# Altium footprint library ThanhNT.PcbLib: 579 footprints (part 7 of 37)
Each footprint in its own frame and in the unit in brackets; x right, y up, seen from the top. Pads: shape width x height; smd on the part's side, far side on the other; paste and mask are expansions set on the pad; w line width, h text height; cw(c..) or ccw(c..) is an arc to the next point about the centre after c.
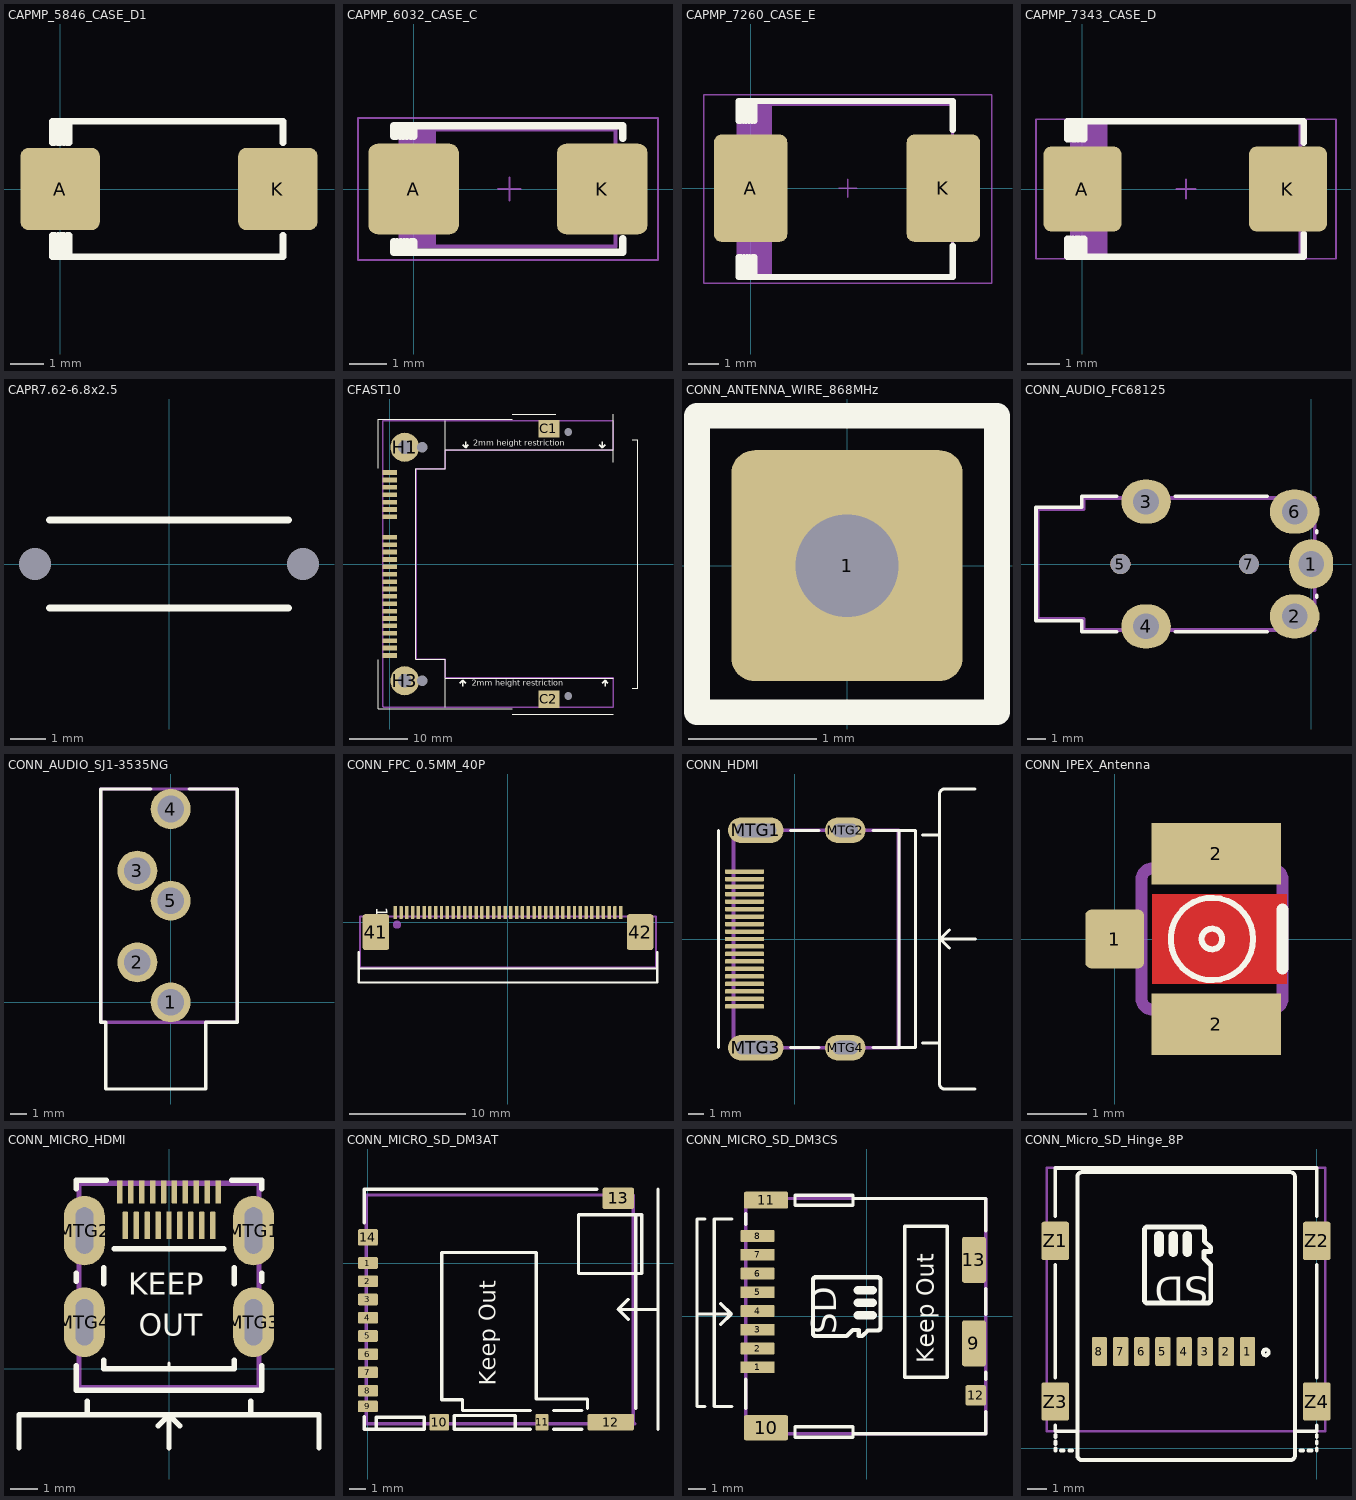
[diagram p6: the footprints below, top view; thin cyan lines are the x and y axes]

## CAPMP_5846_CASE_D1 [mm] "Tatalum Capacitor SMD (5846_2318), Molded body capacitor"
height 3.2
pads (2):
  rrect20% 2.4x2.5 smd: A(0,0) K(6.6,0)
Top Overlay:
  lines w0.2: -0.243,-1.412 -0.243,-2.057 6.757,-2.057 6.757,-1.397 ; -0.243,1.412 -0.243,2.057 6.757,2.057 6.757,1.397 ; -0.178,1.412 -0.178,2.057 ; -0.167,-2.057 -0.167,-1.412 ; -0.076,1.412 -0.076,2.057 ; -0.065,-2.057 -0.065,-1.412 ; 0,1.412 0,2.057 ; 0.036,-2.057 0.036,-1.412 ; 0.102,1.412 0.102,2.057 ; 0.112,-2.057 0.112,-1.412 ; 0.203,1.412 0.203,2.057 ; 0.214,-2.057 0.214,-1.412 ; 0.279,-2.057 0.279,-1.412 ; 0.279,1.412 0.279,2.057
3D body "User Library-CaseD_7343-31.STEP": height 2.8, standoff 0, extent -0.348,-2.15 6.952,2.15

## CAPMP_6032_CASE_C [mm] "Tatalum Capacitor SMD (6032_2412), Molded body capacitor"
height 2.6
pads (2):
  rrect20% 2.4x2.4 smd: A(0,0) K(5,0)
Top Overlay:
  lines w0.2: -0.523,-1.397 -0.523,-1.676 5.537,-1.676 5.537,-1.321 ; -0.523,1.397 -0.523,1.676 5.537,1.676 5.537,1.346 ; -0.457,1.397 -0.457,1.676 ; -0.446,-1.676 -0.446,-1.397 ; -0.356,1.397 -0.356,1.676 ; -0.345,-1.676 -0.345,-1.397 ; -0.279,1.397 -0.279,1.676 ; -0.243,-1.676 -0.243,-1.397 ; -0.178,1.397 -0.178,1.676 ; -0.167,-1.676 -0.167,-1.397 ; -0.076,1.397 -0.076,1.676 ; -0.065,-1.676 -0.065,-1.397 ; 0,-1.676 0,-1.397 ; 0,1.397 0,1.676
Mechanical 15:
  lines w0.05: 2.24,0 2.84,0 ; 2.54,-0.3 2.54,0.3 ; -1.473,-1.88 6.477,-1.88 6.477,1.88 -1.473,1.88 -1.473,-1.88
Mechanical 16:
  rectangle: -0.5,-1.075 -0.3,1.125
  region: 5.5,1.125 5.3,1.125 5.3,-1.075 5.5,-1.075
  rectangle: -0.35,-1.525 0.6,1.575
  lines w0.102: -0.35,-1.525 5.35,-1.525 5.35,1.575 -0.35,1.575 -0.35,-1.525
3D body "User Library-CaseC_6032-28.STEP": height 2.5, standoff 0, extent -0.46,-1.6 5.54,1.6

## CAPMP_7260_CASE_E [mm] "Tatalum Capacitor SMD (7260_2824), Molded body capacitor"
height 4.1
pads (2):
  rrect20% 2.4x3.5 smd: A(0,0) K(6.3,0)
Top Overlay:
  lines w0.2: -0.396,-2.25 -0.396,-2.896 6.604,-2.896 6.604,-1.88 ; -0.396,2.199 -0.396,2.845 6.604,2.845 6.604,1.905 ; -0.33,2.199 -0.33,2.845 ; -0.319,-2.896 -0.319,-2.25 ; -0.229,2.199 -0.229,2.845 ; -0.218,-2.896 -0.218,-2.25 ; -0.152,2.199 -0.152,2.845 ; -0.116,-2.896 -0.116,-2.25 ; -0.051,2.199 -0.051,2.845 ; -0.04,-2.896 -0.04,-2.25 ; 0.051,2.199 0.051,2.845 ; 0.062,-2.896 0.062,-2.25 ; 0.127,-2.896 0.127,-2.25 ; 0.127,2.199 0.127,2.845
Mechanical 15:
  lines w0.05: 2.875,0 3.475,0 ; 3.175,-0.3 3.175,0.3 ; -1.525,-3.099 -1.525,3.048 7.875,3.048 7.875,-3.099 -1.525,-3.099
Mechanical 16:
  rectangle: -0.401,-2.845 0.699,2.743
  region: 6.749,1.251 6.549,1.251 6.549,-1.149 6.749,-1.149
  rectangle: -0.551,-1.149 -0.351,1.251
  lines w0.102: -0.401,-2.845 -0.401,2.743 6.599,2.743 6.599,-2.845 -0.401,-2.845
3D body "User Library-CaseE_7260-38.STEP": height 3.6, standoff 0, extent -0.526,-3.025 6.774,2.975

## CAPMP_7343_CASE_D [mm] "Tatalum Capacitor SMD (7343_2916), Molded body capacitor"
height 2.9
pads (2):
  rrect20% 2.4x2.6 smd: A(0,0) K(6.3,0)
Top Overlay:
  lines w0.2: -0.472,-1.52 -0.472,-2.083 6.782,-2.083 6.782,-1.372 ; -0.472,1.52 -0.472,2.083 6.782,2.083 6.782,1.423 ; -0.406,1.52 -0.406,2.083 ; -0.396,-2.083 -0.396,-1.52 ; -0.305,1.52 -0.305,2.083 ; -0.294,-2.083 -0.294,-1.52 ; -0.229,1.52 -0.229,2.083 ; -0.192,-2.083 -0.192,-1.52 ; -0.127,1.52 -0.127,2.083 ; -0.116,-2.083 -0.116,-1.52 ; -0.025,1.52 -0.025,2.083 ; -0.015,-2.083 -0.015,-1.52 ; 0.051,-2.083 0.051,-1.52 ; 0.051,1.52 0.051,2.083
Mechanical 15:
  lines w0.05: 2.875,0 3.475,0 ; 3.175,-0.3 3.175,0.3 ; -1.425,-2.134 -1.425,2.134 7.775,2.134 7.775,-2.134 -1.425,-2.134
Mechanical 16:
  rectangle: -0.475,-1.2 -0.275,1.2
  region: 6.825,1.2 6.625,1.2 6.625,-1.2 6.825,-1.2
  rectangle: -0.325,-2.1 0.775,2.1
  lines w0.102: -0.325,-2.1 6.675,-2.1 6.675,2.1 -0.325,2.1 -0.325,-2.1
3D body "User Library-CaseD_7343-31.STEP": height 2.8, standoff 0, extent -0.526,-2.15 6.774,2.15

## CAPR7.62-6.8x2.5 [mil] "Capacitor, MF, Thru-Hole, Dipped Radial; Body 6.8 x 2.5 mm (WxT) Pin Spacing 7.62 mm (typ)"
height 236.22
pads (2):
  round 0 / inner round 0 / far side oval 100x85 hole 36 unplated: 1(-150,0) 2(150,0)
Top Overlay:
  lines w7.87: -133.86,-49.21 133.86,-49.21 ; -133.86,49.21 133.86,49.21
3D body "CAPMF_10.3x6.0x13.0mm WxTxH 7.5mmLS.STEP": height 511.81, standoff -100, extent -202.75,-118.1 202.76,118.12

## CFAST10 [mm]
pads (32):
  rect 3.6x3 smd: C1(27.35,23.3) C2(27.35,-23.3)
  round 5 hole 2.3 mask+0.025: H1(2.55,20.08) H3(2.55,-20.08)
  round 0 hole 1.75 unplated: H2(5.55,20.08) H4(5.55,-20.08)
  round 0 hole 1.35 unplated: H5(30.65,22.7) H6(30.65,-22.7)
  rect 2.5x0.8 smd: PC1(0,4.595) PC2(0,3.325) PC3(0,2.055) PC4(0,0.785) PC5(0,-0.485) PC6(0,-1.755) PC7(0,-3.025) PC8(0,-4.295) PC9(0,-5.565) PC10(0,-6.835) PC11(0,-8.105) PC12(0,-9.375) PC13(0,-10.645) PC14(0,-11.915) PC15(0,-13.185) PC16(0,-14.455) PC17(0,-15.725) S1(0,15.725) S2(0,14.455) S3(0,13.185) S4(0,11.915) S5(0,10.645) S6(0,9.375) S7(0,8.105)
Top Overlay:
  lines w0.2: -2,-16.5 -2,-24.9 21,-24.9 ; -2,16.5 -2,24.9 21,24.9 ; 9.47,-24.6 9.47,-16.4 4.47,-16.4 4.47,16.4 9.47,16.4 9.47,24.6 ; 9.47,-19.615 38.4,-19.615 ; 9.47,19.615 38.4,19.615 ; 21,-25.8 38.4,-25.8 ; 21,25.8 28.5,25.8 ; 38.4,17.5 38.4,25.8 ; 41.7,-21.4 42.6,-21.4 42.6,21.4 41.7,21.4
  lines w0.254: 12,-20.5 12.5,-20 ; 12.5,-21 12.5,-20 ; 12.5,20.5 13,20 ; 13,-20.5 12.5,-20 ; 13,21 13,20 ; 13.5,20.5 13,20 ; 36,20.5 36.5,20 ; 36.5,-20.5 37,-20 ; 36.5,21 36.5,20 ; 37,-21 37,-20 ; 37,20.5 36.5,20 ; 37.5,-20.5 37,-20 ; 36.5,20 36.5,20
  text "2mm height restriction" at 14.3,20.3 h1
  text "2mm height restriction" at 14.1,-20.9 h1
Mechanical 16:
  lines w0.254: -1.2,-24.5 -1.2,24.6 38.4,24.6 38.4,19.6 9.5,19.6 9.5,16.5 9.4,16.4 4.5,16.4 4.5,-16.4 9.5,-16.4 9.5,-19.6 38.4,-19.6 38.4,-24.6 -1.1,-24.6 -1.2,-24.5
Mechanical 29:
  text ".Designator" at 0.9,1 h1.52
3D body "N7G24-AOB2-XX-10-OHT_STP.stp": height 7.69, standoff -0.91, extent -1.03,-24.25 38.2,24.25
3D body "7E50-C016-00_STP.stp": height 9.7, standoff 1.42, extent 45.022,-24.835 92.252,23.783

## CONN_ANTENNA_WIRE_868MHz [mm]
pads (1):
  rrect20% 1.8x1.8 hole 0.8: 1(0,0)
Top Overlay:
  lines w0.2: -1.168,-1.143 1.168,-1.143 1.168,1.168 -1.168,1.168 -1.168,-1.143
3D body "User Library-ANTENNA_868MHz.STEP": height 6.15, standoff -2.25, extent -4.166,-0.412 2.134,17.888

## CONN_AUDIO_FC68125 [mm]
pads (7):
  oval 2.4x2.7 hole 1.4: 1(0,0)
  oval 2.7x2.4 hole 1.4: 2(-0.9,-2.85) 3(-9,3.4) 4(-9,-3.4) 6(-0.9,2.85)
  round 1.1 hole 1.1 unplated: 5(-10.4,0) 7(-3.4,0)
Top Overlay:
  lines w0.2: -10.6,-3.7 -12.5,-3.7 -12.5,-3.1 -15,-3.1 -15,3.1 -12.5,3.1 -12.5,3.7 -10.6,3.7 ; -7.4,-3.7 -2.4,-3.7 ; -7.4,3.7 -2.4,3.7 ; 0.3,-1.8 0.3,-1.7 ; 0.3,1.7 0.3,1.8
Mechanical 16:
  lines w0.2: -14.9,-3 -14.9,3 -12.4,3 -12.4,3.6 0.2,3.6 0.2,-3.6 -12.4,-3.6 -12.4,-3 -14.9,-3
3D body: height 6, standoff 0, extent -12.4,-3.6 0.2,3.6
3D body: height 5.98, standoff 0, extent -14.876,-2.988 -12.376,3

## CONN_AUDIO_SJ1-3535NG [mm]
pads (5):
  round 2.4 hole 1.6: 1(0,0) 2(-2,2.4) 3(-2,7.9) 4(0,11.6) 5(0,6.1)
Top Overlay:
  lines w0.2: -1.2,12.8 -4.2,12.8 -4.2,-1.2 -3.9,-1.2 -3.9,-5.2 2.1,-5.2 2.1,-1.2 4,-1.2 4,12.8 1.1,12.8
Top Solder:
  region: -1.65,8.65 0.65,6.35 -0.35,5.35 -2.65,7.65
Mechanical 1:
  lines w0.2: -4.2,12.8 -4.2,12.8
Mechanical 16:
  lines w0.2: -4.2,-1.2 -4.2,12.8 4,12.8 4,-1.2 -4.2,-1.2
3D body "SJ1-3535NG-PI.step": height 12.3, standoff -3.3, extent -4.2,-5.25 4,12.8

## CONN_FPC_0.5MM_40P [mm] "FPC CONN. 0.5MM PITCH B/C, 40P - (4-1734592-0)"
pads (42):
  rrect20% 0.3x1.1 smd mask+0.025: 1(-9.75,0.85) 2(-9.25,0.85) 3(-8.75,0.85) 4(-8.25,0.85) 5(-7.75,0.85) 6(-7.25,0.85) 7(-6.75,0.85) 8(-6.25,0.85) 9(-5.75,0.85) 10(-5.25,0.85) 11(-4.75,0.85) 12(-4.25,0.85) 13(-3.75,0.85) 14(-3.25,0.85) 15(-2.75,0.85) 16(-2.25,0.85) 17(-1.75,0.85) 18(-1.25,0.85) 19(-0.75,0.85) 20(-0.25,0.85) 21(0.25,0.85) 22(0.75,0.85) 23(1.25,0.85) 24(1.75,0.85) 25(2.25,0.85) 26(2.75,0.85) 27(3.25,0.85) 28(3.75,0.85) 29(4.25,0.85) 30(4.75,0.85) 31(5.25,0.85) 32(5.75,0.85) 33(6.25,0.85) 34(6.75,0.85) 35(7.25,0.85) 36(7.75,0.85) 37(8.25,0.85) 38(8.75,0.85) 39(9.25,0.85) 40(9.75,0.85)
  rrect20% 2.3x3.1 smd mask+0.076: 41(-11.42,-0.85) 42(11.42,-0.85)
Top Overlay:
  lines w0.2: -12.9,-2.6 -12.9,-4 ; 12.9,-2.6 12.9,-4 ; -12.9,-4 12.9,-4 ; -12.9,-4 -12.9,-5.2 12.9,-5.2 12.9,-4
  text "1" at -11.4,1.3 h1.02
Mechanical 16:
  circle w0.5: c-9.6,-0.2 r0.1
  lines w0.2: -12.8,-3.9 -12.8,0.5 12.8,0.5 12.8,-3.9 -12.8,-3.9
3D body "c-4-1734592-0-c-3d.stp": height 2.05, standoff 0, extent -12.715,-3.955 12.715,1.155

## CONN_HDMI [mm]
pads (23):
  rrect20% 2.6x0.3 smd mask+0.025: 1(-3.36,4.5) 2(-3.36,4) 3(-3.36,3.5) 4(-3.36,3) 5(-3.36,2.5) 6(-3.36,2) 7(-3.36,1.5) 8(-3.36,1) 9(-3.36,0.5) 10(-3.36,0) 11(-3.36,-0.5) 12(-3.36,-1) 13(-3.36,-1.5) 14(-3.36,-2) 15(-3.36,-2.5) 16(-3.36,-3) 17(-3.36,-3.5) 18(-3.36,-4) 19(-3.36,-4.5)
  oval 3.7x1.7 hole 0.9 slot 2.7 at 0 deg: MTG1(-2.6,7.25) MTG3(-2.6,-7.25)
  oval 2.7x1.7 hole 0.9 slot 1.7 at 0 deg: MTG2(3.36,7.25) MTG4(3.36,-7.25)
Top Overlay:
  lines w0.2: -5.1,-7.25 -5.1,7.25 ; -0.3,-7.25 1.6,-7.25 ; -0.3,7.25 1.6,7.25 ; 5.2,-7.25 8.05,-7.25 8.05,7.25 5.2,7.25 ; 6.95,-7.2 6.95,7.25 ; 8.5,-6.95 9.65,-6.95 ; 8.5,6.95 9.65,6.95 ; 9.95,10 12,10 ; 10,10 ccw(c9.975,9.675) 9.65,9.7 9.65,-9.7 ccw(c9.975,-9.675) 10,-10 12,-10 ; 10.3,-0.6 9.7,0 ; 10.3,0.6 9.7,0 ; 12.05,0 9.7,0
Mechanical 1:
  text "go over the board edge" at -4.307,10.78 h0.5
  text "NOTE: Bottom plastic may" at -4.307,11.68 h0.5
Mechanical 16:
  lines w0.254: -4.1,-7.25 6.9,-7.25 6.9,7.25 -4.1,7.25 -4.1,-7.25
3D body "471510001.stp": height 6.28, standoff -2.1, extent -4.2,-7.5 7.95,7.5

## CONN_IPEX_Antenna [mm] "IPEX-20279-001E"
pads (3):
  rrect20% 1x1 smd: 1(0,0)
  rect 2.2x1.05 smd: 2(1.727,-1.448) 2(1.727,1.448)
Top Layer:
  pour cut-out: 0.635,0.762 0.635,-0.762 2.921,-0.762 2.921,0.762
Top Overlay:
  circle w0.102: c1.651,0 r0.7
  circle w0.102: c1.651,0 r0.175
  lines w0.203: 2.851,-0.5 2.851,0.5
Mechanical 16:
  region: 0.351,-0.3 0.351,0.3 0.101,0.3 0.101,-0.3
  lines w0.203: 0.451,-1 ccw(c0.651,-1) 0.651,-1.2 2.651,-1.2 ccw(c2.651,-1) 2.851,-1 2.851,1 ccw(c2.651,1) 2.651,1.2 0.651,1.2 ccw(c0.651,1) 0.451,1 0.451,-1
3D body "User Library-20279-001.STEP": height 1.25, standoff -0.01, extent 0.152,-1.5 3.252,1.5

## CONN_MICRO_HDMI [mm]
pads (23):
  rrect20% 0.2x0.85 smd mask+0.03: 1(1.8,6.475) 3(1.4,6.475) 5(1,6.475) 7(0.6,6.475) 9(0.2,6.475) 11(-0.2,6.475) 13(-0.6,6.475) 15(-1,6.475) 17(-1.4,6.475) 19(-1.8,6.475)
  rrect20% 0.2x1 smd mask+0.03: 2(1.6,5.25) 4(1.2,5.25) 6(0.8,5.25) 8(0.4,5.25) 10(0,5.25) 12(-0.4,5.25) 14(-0.8,5.25) 16(-1.2,5.25) 18(-1.6,5.25)
  oval 1.5x2.55 hole 0.65 slot 1.7 at 90 deg: MTG1(3.1,5.06) MTG2(-3.1,5.06) MTG3(3.1,1.7) MTG4(-3.1,1.7)
Top Overlay:
  lines w0.1: 0,0 0,0.2
  lines w0.2: -5.5,-2.9 -5.5,-1.7 5.5,-1.7 5.5,-2.9 ; -3.4,0.1 -3.4,-0.8 3.4,-0.8 3.4,0.1 ; -3.4,3.2 -3.4,3.5 ; -3.4,6.6 -3.4,6.9 -2.3,6.9 ; -3,-1.7 -3,-1.2 ; -2.4,0.3 -2.4,0 2.4,0 2.4,0.3 ; -2.4,3.1 -2.4,3.7 ; -2,4.4 2,4.4 ; -0.4,-2.1 0,-1.7 ; 0,-2.9 0,-1.7 ; 0.4,-2.1 0,-1.7 ; 2.3,6.9 3.4,6.9 3.4,6.6 ; 2.4,3.1 2.4,3.7 ; 3,-1.7 3,-1.2 ; 3.4,3.2 3.4,3.5
  text "OUT" at -1.1,1.2 h0.8
  text "KEEP" at -1.5,2.7 h0.8
Mechanical 16:
  lines w0.2: -3.3,-0.7 -3.3,6.8 3.3,6.8 3.3,-0.7 -3.3,-0.7
3D body "467651301.stp": height 2.97, standoff -0.55, extent -3.25,-0.7 3.25,6.8

## CONN_MICRO_SD_DM3AT [mm]
pads (14):
  rrect20% 1.2x0.7 smd: 1(0,0) 2(0,-1.1) 3(0,-2.2) 4(0,-3.3) 5(0,-4.4) 6(0,-5.5) 7(0,-6.6)
  rrect20% 1.2x0.7 smd mask+0.07: 8(0,-7.7) 9(0,-8.65)
  rrect20% 1.2x1 smd: 10(4.3,-9.6) 14(0,1.55)
  rrect20% 0.8x1 smd: 11(10.5,-9.6)
  rrect20% 2.8x1 smd: 12(14.65,-9.6)
  rrect20% 1.9x1.3 smd: 13(15.1,3.9)
Top Overlay:
  lines w0.2: -0.231,-9.271 -0.231,-10.033 3.4,-10.033 ; -0.231,2.413 -0.231,4.445 13.8,4.445 ; 0.5,-10.033 0.5,-9.3 3.4,-9.3 3.4,-10.004 ; 8.89,-10.033 8.89,-9.21 8.89,-9.2 5.2,-9.2 5.2,-10.033 9.8,-10.033 ; 9.8,-8.9 5.7,-8.9 5.7,-8.255 4.445,-8.255 4.445,0.635 10.16,0.635 10.16,-8.2 13.245,-8.2 13.245,-8.755 ; 11.2,-10.033 12.9,-10.033 ; 11.2,-8.9 12.9,-8.9 ; 15.7,-3.4 15.1,-2.8 ; 15.7,-2.2 15.1,-2.8 ; 16.152,-8.763 16.152,2.921 ; 17.45,-2.8 15.1,-2.8 ; 17.495,-10.033 17.495,4.445 ; 12.7,-0.635 16.51,-0.635 16.51,2.921 12.7,2.921 12.7,-0.635
  text "Keep Out" at 7.7,-7.4 h1
Mechanical 16:
  lines w0.2: -0.1,-9.7 16.1,-9.7 16,-9.6 16,4.1 -0.1,4.1 -0.1,-9.7
3D body "DM3AT-SF-PEJM5.stp": height 1.68, standoff 0, extent -0.1,-9.7 16.05,4.15

## CONN_MICRO_SD_DM3CS [mm]
pads (13):
  rrect20% 2x0.7 smd: 1(-6.4,-2.998) 2(-6.4,-1.898) 3(-6.4,-0.798) 4(-6.4,0.302) 5(-6.4,1.402) 6(-6.4,2.502) 7(-6.4,3.602) 8(-6.4,4.702)
  rrect20% 1.4x2.7 smd: 9(6.3,-1.598) 13(6.3,3.302)
  rrect20% 2.6x1.5 smd: 10(-5.9,-6.548)
  rrect20% 2.6x1 smd: 11(-5.9,6.802)
  rrect20% 1.2x1.2 smd: 12(6.4,-4.648)
Top Overlay:
  lines w0.2: -9.95,0.127 -7.95,0.127 ; -9.5,-5.298 -9.95,-5.298 -9.95,5.702 -9.5,5.702 ; -8.55,-0.473 -7.95,0.127 ; -8.55,0.727 -7.95,0.127 ; -7.9,-5.298 -8.95,-5.298 -8.95,5.702 -7.9,5.702 ; -7.1,-5.398 -7.1,-3.698 ; -7.1,5.402 -7.1,6.002 ; -0.8,-6.898 7,-6.898 7,-5.598 ; -0.8,6.902 7,6.902 7,5.002 ; 7,-3.698 7,-3.298 ; 7,0.102 7,1.602 ; -4.2,-7.098 -0.8,-7.098 -0.8,-6.498 -4.2,-6.498 -4.2,-7.098 ; -4.2,6.502 -4.2,7.102 -0.8,7.102 -0.8,6.502 -4.2,6.502 ; 2.235,-3.573 4.735,-3.573 4.735,5.277 2.235,5.277 2.235,-3.573
  lines w0.254: -3.15,-0.995 ccw(c-2.976,-0.995) -3.099,-1.118 ccw(c-2.976,-0.995) -2.976,-1.168 -2.896,-1.168 -1.168,-1.168 -0.813,-0.813 -0.457,-0.813 -0.457,-1.168 -0.254,-1.168 0.076,-0.838 0.559,-0.838 0.639,-0.838 ccw(c0.639,-0.665) 0.762,-0.787 ccw(c0.639,-0.665) 0.813,-0.665 0.813,-0.584 0.813,2.032 0.813,2.113 ccw(c0.639,2.113) 0.762,2.235 ccw(c0.639,2.113) 0.639,2.286 0.559,2.286 -2.896,2.286 -2.976,2.286 ccw(c-2.976,2.113) -3.099,2.235 ccw(c-2.976,2.113) -3.15,2.113 -3.15,2.032 -3.15,-0.914 -3.15,-0.995
  lines w0.508: -0.508,0.051 0.356,0.051 ; -0.508,0.787 0.356,0.787 ; -0.508,1.524 0.356,1.524
  text "Keep Out" at 3.935,-2.773 h1
  text "SD" at -1.295,-1.067 h2.5
Mechanical 16:
  lines w0.2: -7.1,-6.898 7,-6.898 7,6.902 -7.1,6.902 -7.1,-6.898
3D body "DM3CS-SF.stp": height 1.98, standoff 0.05, extent -7.1,-6.898 7,6.902

## CONN_Micro_SD_Hinge_8P [mm] "WR-CRD Micro SD_Hinge_8 pins (MicroSD TF v2 - MinhHa)"
height 1.75
pads (12):
  rrect20% 0.8x1.5 smd: 1(-3.601,5.028) 2(-4.701,5.028) 3(-5.801,5.028) 4(-6.901,5.028) 5(-8.001,5.028) 6(-9.101,5.028) 7(-10.201,5.028) 8(-11.301,5.028)
  rrect20% 1.45x2 smd: Z1(-13.601,10.778) Z2(-0.001,10.778) Z3(-13.601,2.428) Z4(-0.001,2.428)
Top Overlay:
  circle w0.2: c-2.651,4.978 r0.15
  lines w0.2: -13.6,1.194 -13.6,0.878 -12.451,0.878 ; -13.6,3.683 -13.6,9.525 ; -13.601,12.066 -13.601,14.578 -0.001,14.578 -0.001,12.066 ; -13.58,-0.124 -13.58,-0.003 ; -13.58,0.226 -13.58,0.347 ; -13.58,0.578 -13.58,0.688 ; -13.297,-0.125 -13.155,-0.125 ; -12.873,-0.125 -12.732,-0.125 ; -1.381,14.353 cw(c-1.381,14.103) -1.131,14.103 -1.131,-0.122 -1.131,-0.372 cw(c-1.381,-0.372) -1.381,-0.622 ; -1.376,14.353 -12.201,14.353 ccw(c-12.201,14.103) -12.451,14.103 -12.451,-0.122 -12.451,-0.372 ccw(c-12.201,-0.372) -12.201,-0.622 -1.376,-0.622 ; -1.129,0.878 0,0.878 0,1.194 ; -0.849,-0.122 -0.707,-0.122 ; -0.425,-0.122 -0.284,-0.122 ; 0,-0.121 0,0 ; 0,0.229 0,0.35 ; 0,0.581 0,0.691 ; 0,3.683 0,9.525
  lines w0.254: -8.966,7.717 ccw(c-8.793,7.717) -8.915,7.595 ccw(c-8.793,7.717) -8.793,7.544 -8.712,7.544 -5.766,7.544 -5.685,7.544 ccw(c-5.685,7.717) -5.563,7.595 ccw(c-5.685,7.717) -5.512,7.717 -5.512,7.798 -5.512,9.525 -5.867,9.881 -5.867,10.236 -5.512,10.236 -5.512,10.439 -5.842,10.77 -5.842,11.252 -5.842,11.333 ccw(c-6.015,11.333) -5.893,11.455 ccw(c-6.015,11.333) -6.015,11.506 -6.096,11.506 -8.712,11.506 -8.793,11.506 ccw(c-8.793,11.333) -8.915,11.455 ccw(c-8.793,11.333) -8.966,11.333 -8.966,11.252 -8.966,7.798 -8.966,7.717
  lines w0.508: -8.204,10.185 -8.204,11.049 ; -7.468,10.185 -7.468,11.049 ; -6.731,10.185 -6.731,11.049
  text "SD" at -5.613,9.398 h2.5
Mechanical 13:
  lines w0.127: -14.051,0.878 0.449,0.878 0.449,14.578 -14.051,14.578 -14.051,0.878
3D body "693072010801.stp": height 1.78, standoff 0.01, extent -14.051,0.878 0.449,14.578